# Altium footprint library PCB_ConnectorHDR.PcbLib: 221 footprints (part 4 of 14)
Each footprint in its own frame and in the unit in brackets; x right, y up, seen from the top. Pads: shape width x height; smd on the part's side, far side on the other; paste and mask are expansions set on the pad; w line width, h text height; cw(c..) or ccw(c..) is an arc to the next point about the centre after c.
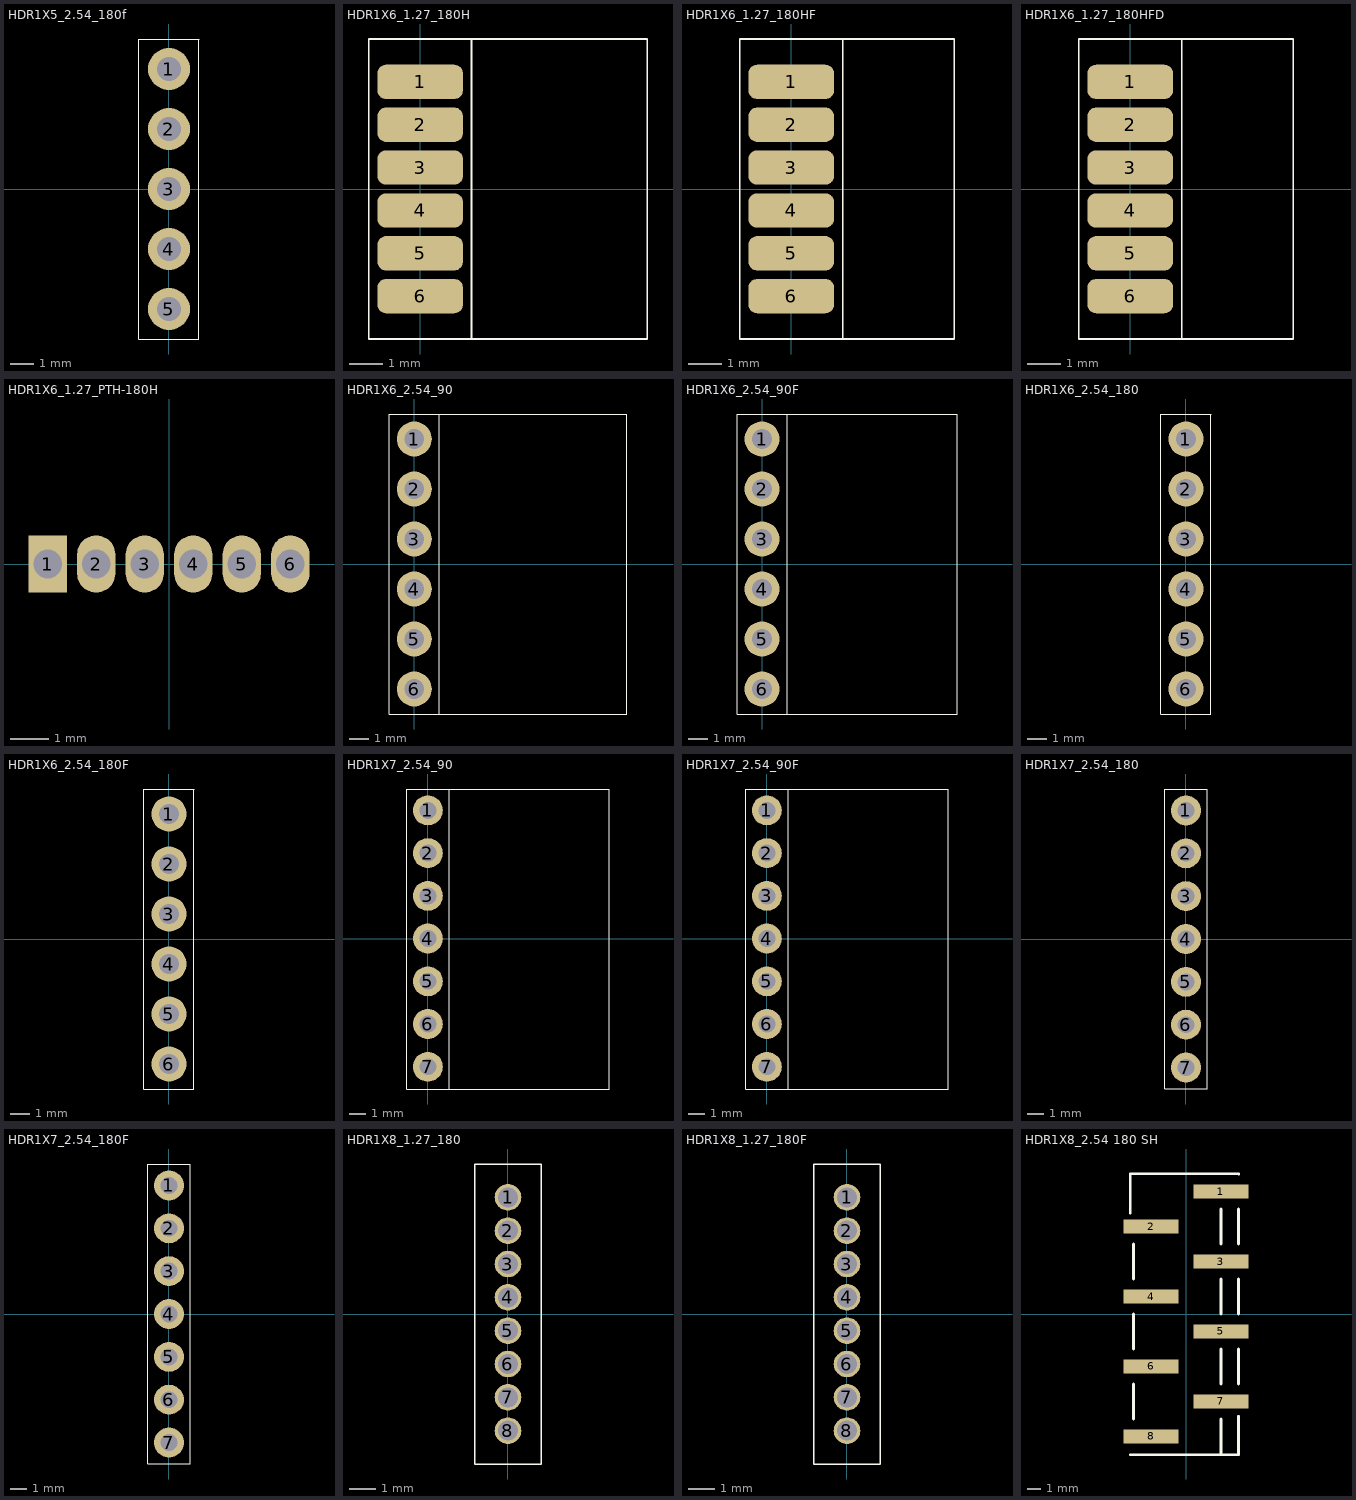
[diagram p3: the footprints below, top view; thin cyan lines are the x and y axes]

## HDR1X5_2.54_180f [mil]
height 169.29
pads (5):
  round 70 hole 39.37: 1(0,200) 2(0,100) 3(0,0) 4(0,-100) 5(0,-200)
Top Overlay:
  lines w2: -50,-250 -50,250 ; -50,-250 50,-250 ; -50,-250 50,-250 ; -50,-250 -50,250 ; -50,250 50,250 ; -50,250 50,250 ; 50,-250 50,250 ; 50,-250 50,250
3D body "female_header_a-bl254-eg-g05d.stp": height 334.65, standoff -125.98, extent -49.21,-254.92 49.22,254.93

## HDR1X6_1.27_180H [mil]
height 169.29
pads (6):
  rrect50% 100x40 smd: 1(0,125) 2(0,75) 3(0,25) 4(0,-25) 5(0,-75) 6(0,-125)
Top Overlay:
  lines w2: -60,-175 -60,175 ; -60,-175 60,-175 60,175 -60,175 ; -60,-175 265,-175 265,175 -60,175 ; -60,-175 -60,175
3D body "pin_header_a-sl127-eg-g06d.stp": height 49.21, standoff -49.21, extent -47.36,-149.99 265.24,150.01

## HDR1X6_1.27_180HF [mil]
height 169.29
pads (6):
  rrect50% 100x40 smd: 1(0,125) 2(0,75) 3(0,25) 4(0,-25) 5(0,-75) 6(0,-125)
Top Overlay:
  lines w2: -60,-175 -60,175 ; -60,-175 190,-175 190,175 -60,175 ; -60,-175 60,-175 60,175 -60,175 ; -60,-175 -60,175
3D body "female_header_a-bl127-eg-g06d.stp": height 35.43, standoff -35.43, extent -38.35,-157.88 190,157.88

## HDR1X6_1.27_180HFD [mil]
height 169.29
pads (6):
  rrect50% 100x40 smd: 1(0,125) 2(0,75) 3(0,25) 4(0,-25) 5(0,-75) 6(0,-125)
Top Overlay:
  lines w2: -60,-175 -60,175 ; -60,-175 60,-175 60,175 -60,175 ; -60,-175 190,-175 190,175 -60,175 ; -60,-175 -60,175
3D body "female_header_a-bl127-eg-g06d.stp": height 71.43, standoff 0.57, extent -38.35,-157.88 190,157.88

## HDR1X6_1.27_PTH-180H [mm]
height 4.3
pads (6):
  rect 1x1.5 hole 0.75: 1(-3.175,0)
  oval 1x1.5 hole 0.75: 2(-1.905,0) 3(-0.635,0) 4(0.635,0) 5(1.905,0) 6(3.175,0)
3D body "_ _ _B061NGCN-RC.STEP": height 2.21, standoff -2.29, extent -4.06,-0.025 3.96,4.95

## HDR1X6_2.54_90 [mil]
height 169.29
pads (6):
  round 70 hole 39.37: 1(0,250) 2(0,150) 3(0,50) 4(0,-50) 5(0,-150) 6(0,-250)
Top Overlay:
  lines w2: -50,-300 -50,300 ; -50,-300 425,-300 425,300 -50,300 ; -50,-300 -50,300 ; -50,-300 50,-300 50,300 -50,300
3D body "pin_header_aw140-ea-g06g.stp": height 99.21, standoff -93.7, extent -14.96,-296.06 423.62,296.07

## HDR1X6_2.54_90F [mil]
height 169.29
pads (6):
  round 70 hole 39.37: 1(0,250) 2(0,150) 3(0,50) 4(0,-50) 5(0,-150) 6(0,-250)
Top Overlay:
  lines w2: -50,-300 -50,300 ; -50,-300 50,-300 50,300 -50,300 ; -50,-300 390,-300 390,300 -50,300 ; -50,-300 -50,300
3D body "female_header_a-bl254-ea-g06d.stp": height 99.21, standoff -125.2, extent -10,-304.92 386.06,304.92

## HDR1X6_2.54_180 [mil]
height 169.29
pads (6):
  round 70 hole 39.37: 1(0,250) 2(0,150) 3(0,50) 4(0,-50) 5(0,-150) 6(0,-250)
Top Overlay:
  lines w2: -50,-300 -50,300 ; -50,-300 50,-300 ; -50,-300 -50,300 ; -50,-300 50,-300 ; -50,300 50,300 ; -50,300 50,300 ; 50,-300 50,300 ; 50,-300 50,300
3D body "pin_header_aw140-eg-g06d.stp": height 322.83, standoff -118.11, extent -49.18,-300 49.18,300

## HDR1X6_2.54_180F [mil]
height 169.29
pads (6):
  round 70 hole 39.37: 1(0,250) 2(0,150) 3(0,50) 4(0,-50) 5(0,-150) 6(0,-250)
Top Overlay:
  lines w2: -50,-300 -50,300 ; -50,-300 50,-300 ; -50,-300 50,-300 ; -50,-300 -50,300 ; -50,300 50,300 ; -50,300 50,300 ; 50,-300 50,300 ; 50,-300 50,300
3D body "female_header_a-bl254-eg-g06d.stp": height 334.65, standoff -125.98, extent -49.21,-304.84 49.21,305

## HDR1X7_2.54_90 [mil]
height 169.29
pads (7):
  round 70 hole 39.37: 1(0,300) 2(0,200) 3(0,100) 4(0,0) 5(0,-100) 6(0,-200) 7(0,-300)
Top Overlay:
  lines w2: -50,-352 50,-352 50,350 -50,350 ; -50,-352 -50,350 ; -50,-352 425,-352 425,350 -50,350 ; -50,-352 -50,350
3D body "pin_header_aw140-ea-g07g.stp": height 98.93, standoff -93.99, extent -13,-347.13 425.58,345

## HDR1X7_2.54_90F [mil]
height 169.29
pads (7):
  round 70 hole 39.37: 1(0,300) 2(0,200) 3(0,100) 4(0,0) 5(0,-100) 6(0,-200) 7(0,-300)
Top Overlay:
  lines w2: -50,-352 425,-352 425,350 -50,350 ; -50,-352 -50,350 ; -50,-352 50,-352 50,350 -50,350 ; -50,-352 -50,350
3D body "female_header_a-bl254-ea-g07d.stp": height 98.93, standoff -125.48, extent -10,-355.84 386.06,354

## HDR1X7_2.54_180 [mil]
height 169.29
pads (7):
  round 70 hole 39.37: 1(0,300) 2(0,200) 3(0,100) 4(0,0) 5(0,-100) 6(0,-200) 7(0,-300)
Top Overlay:
  lines w2: -50,-350 -50,350 ; -50,-350 50,-350 ; -50,-350 -50,350 ; -50,-350 50,-350 ; -50,350 50,350 ; -50,350 50,350 ; 50,-350 50,350 ; 50,-350 50,350
3D body "pin_header_aw140-eg-g07d.stp": height 322.83, standoff -118.11, extent -49.18,-350 49.18,350

## HDR1X7_2.54_180F [mil]
height 169.29
pads (7):
  round 70 hole 39.37: 1(0,300) 2(0,200) 3(0,100) 4(0,0) 5(0,-100) 6(0,-200) 7(0,-300)
Top Overlay:
  lines w2: -50,-350 -50,350 ; -50,-350 50,-350 ; -50,-350 -50,350 ; -50,-350 50,-350 ; -50,350 50,350 ; -50,350 50,350 ; 50,-350 50,350 ; 50,-350 50,350
3D body "female_header_a-bl254-eg-g07d.stp": height 334.65, standoff -125.98, extent -49.21,-354.92 49.22,354.92

## HDR1X8_1.27_180 [mil]
height 169.29
pads (8):
  round 40 hole 30: 1(0,175) 2(0,125) 3(0,75) 4(0,25) 5(0,-25) 6(0,-75) 7(0,-125) 8(0,-175)
Top Overlay:
  lines w2: -50,-225 50,-225 ; -50,-225 -50,225 ; -50,-225 50,-225 ; -50,-225 -50,225 ; -50,225 50,225 ; -50,225 50,225 ; 50,-225 50,225 ; 50,-225 50,225
3D body "pin_header_a-sl127-eg-z08d.stp": height 210.24, standoff -102.36, extent -49.21,-199.99 49.21,200.01

## HDR1X8_1.27_180F [mil]
height 169.29
pads (8):
  round 40 hole 30: 1(0,175) 2(0,125) 3(0,75) 4(0,25) 5(0,-25) 6(0,-75) 7(0,-125) 8(0,-175)
Top Overlay:
  lines w2: -50,-225 -50,225 ; -50,-225 50,-225 ; -50,-225 -50,225 ; -50,-225 50,-225 ; -50,225 50,225 ; -50,225 50,225 ; 50,-225 50,225 ; 50,-225 50,225
3D body "female_header_a-bl127-eg-z08d.stp": height 133.86, standoff -94.49, extent -35.43,-207.88 35.43,207.87

## HDR1X8_2.54 180 SH [mm]
pads (8):
  rect 4x1 smd: 1(2.54,8.89) 2(-2.54,6.35) 3(2.54,3.81) 4(-2.54,1.27) 5(2.54,-1.27) 6(-2.54,-3.81) 7(2.54,-6.35) 8(-2.54,-8.89)
Top Overlay:
  lines w0.2: -4.039,-10.211 3.81,-10.211 3.81,-7.417 ; -4.039,7.315 -4.039,10.185 3.81,10.185 3.835,10.16 ; -3.81,-7.62 -3.81,-5.08 ; -3.81,-2.54 -3.81,0 ; -3.81,2.54 -3.81,5.08 ; 2.54,-10.16 2.54,-7.62 ; 2.54,-5.08 2.54,-2.54 ; 2.54,0 2.54,2.54 ; 2.54,5.08 2.54,7.62 ; 3.81,-5.08 3.81,-2.54 ; 3.81,0 3.81,2.54 ; 3.81,5.08 3.81,7.62
3D body "c-3-647166-8-m-3d.stp": height 10.55, standoff 0.01, extent -3.734,-10.16 4.35,10.16